# Altium footprint library NtentePoC.PcbLib: 32 footprints (part 1 of 2)
Each footprint in its own frame and in the unit in brackets; x right, y up, seen from the top. Pads: shape width x height; smd on the part's side, far side on the other; paste and mask are expansions set on the pad; w line width, h text height; cw(c..) or ccw(c..) is an arc to the next point about the centre after c.
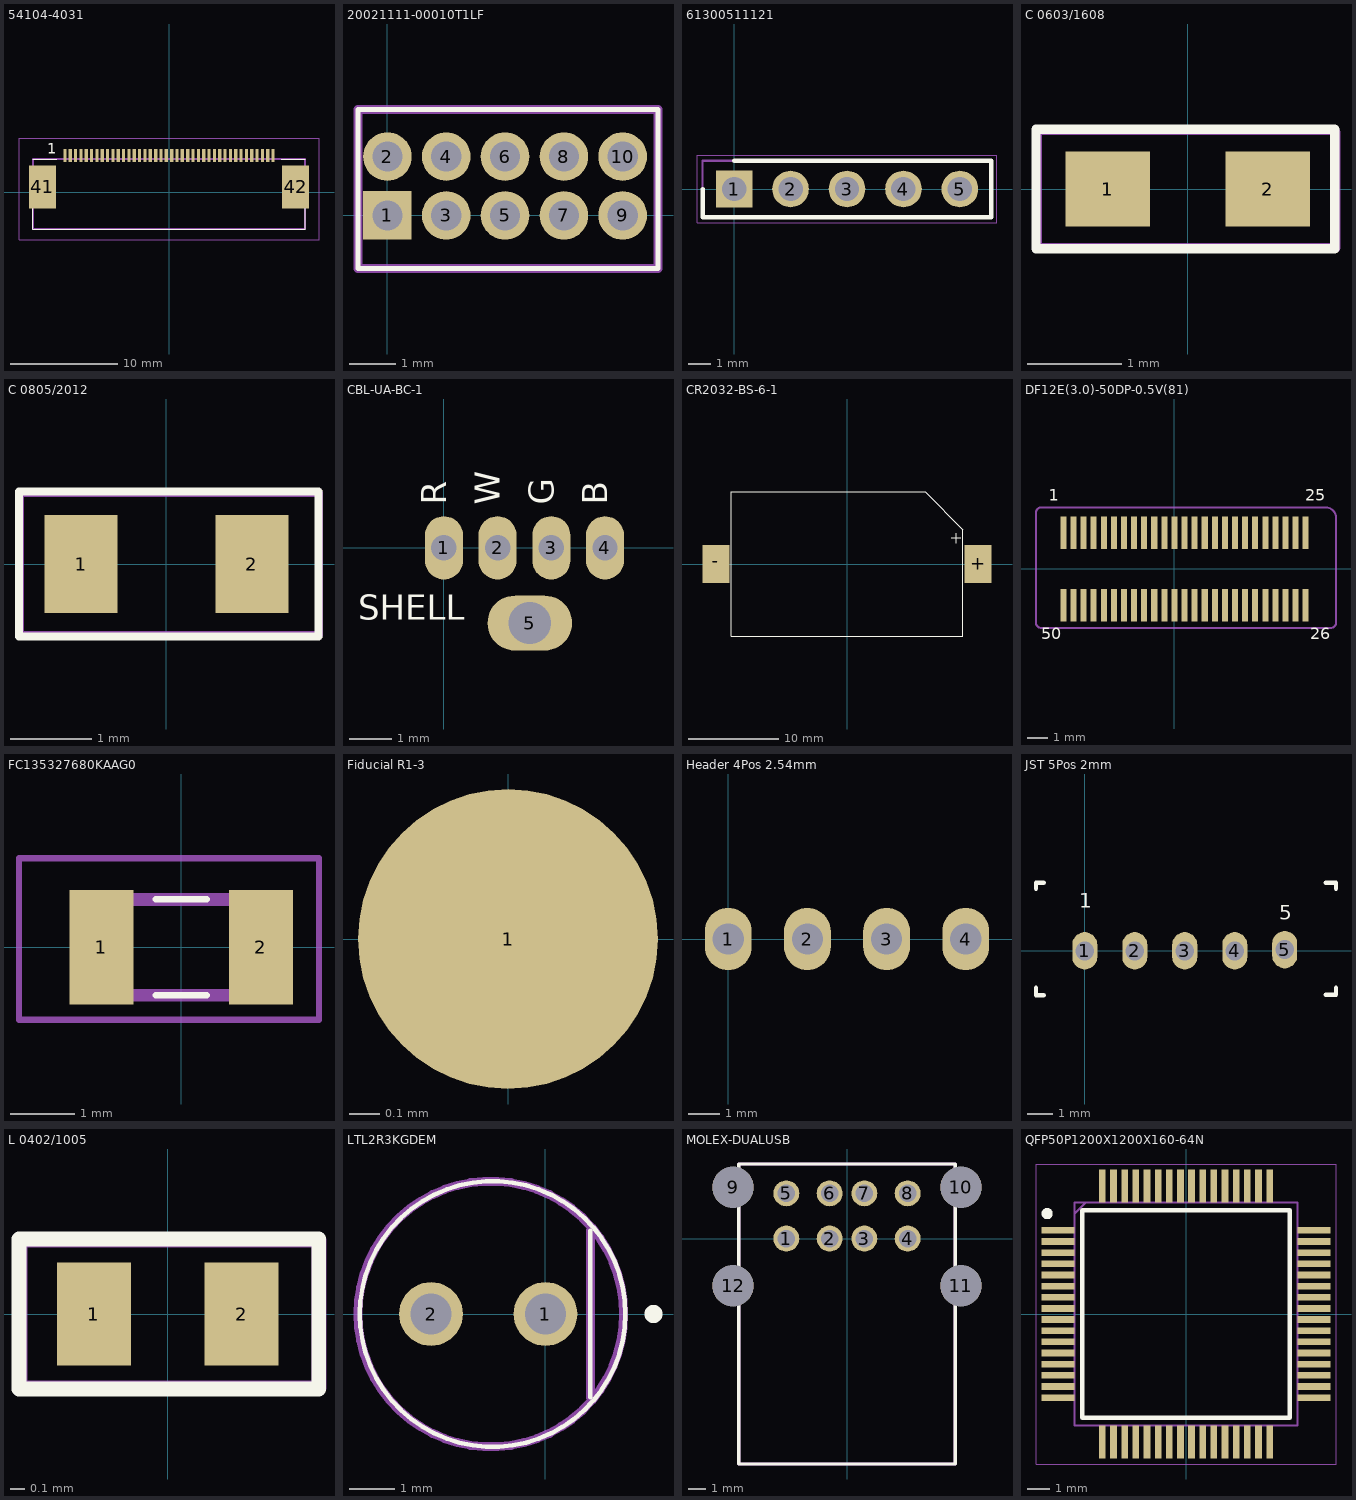
[diagram p0: the footprints below, top view; thin cyan lines are the x and y axes]

## 54104-4031 [mm]
pads (42):
  rect 0.3x1.2 smd: 1(-9.75,3.45) 2(-9.25,3.45) 3(-8.75,3.45) 4(-8.25,3.45) 5(-7.75,3.45) 6(-7.25,3.45) 7(-6.75,3.45) 8(-6.25,3.45) 9(-5.75,3.45) 10(-5.25,3.45) 11(-4.75,3.45) 12(-4.25,3.45) 13(-3.75,3.45) 14(-3.25,3.45) 15(-2.75,3.45) 16(-2.25,3.45) 17(-1.75,3.45) 18(-1.25,3.45) 19(-0.75,3.45) 20(-0.25,3.45) 21(0.25,3.45) 22(0.75,3.45) 23(1.25,3.45) 24(1.75,3.45) 25(2.25,3.45) 26(2.75,3.45) 27(3.25,3.45) 28(3.75,3.45) 29(4.25,3.45) 30(4.75,3.45) 31(5.25,3.45) 32(5.75,3.45) 33(6.25,3.45) 34(6.75,3.45) 35(7.25,3.45) 36(7.75,3.45) 37(8.25,3.45) 38(8.75,3.45) 39(9.25,3.45) 40(9.75,3.45)
  rect 2.5x4 smd: 41(-11.85,0.49) 42(11.85,0.49)
Top Overlay:
  lines w0.1: -12.75,-0.4 -12.75,-3.45 12.75,-3.45 12.75,-0.4 ; -12.75,3.1 -10.5,3.1 ; 10.5,3.1 12.75,3.1
  text "1" at -11.42,3.59 h1
Mechanical 13:
  lines w0.2: -12.75,-3.45 12.75,-3.45 12.75,3.1 -12.75,3.1 -12.75,-3.45
Mechanical 29 (Mech29):
  lines w0.1: -14.05,-4.45 14.05,-4.45 14.05,5.05 -14.05,5.05 -14.05,-4.45
  text ".Designator" at -4.91,-2.05 h1.52
3D body "541044031.stp": height 2, standoff -0.05, extent -12.76,-2.05 12.74,3.55

## 20021111-00010T1LF [mm]
pads (10):
  rect 1.05x1.05 hole 0.65: 1(0,0)
  round 1.05 hole 0.65: 2(0,1.27) 3(1.27,0) 4(1.27,1.27) 5(2.54,0) 6(2.54,1.27) 7(3.81,0) 8(3.81,1.27) 9(5.08,0) 10(5.08,1.27)
Top Overlay:
  lines w0.1: -0.635,-1.145 5.842,-1.145 5.842,2.286 -0.635,2.286 -0.635,-1.145
Mechanical 29 (Mech29):
  lines w0.2: -0.635,-1.145 -0.635,2.286 5.842,2.286 5.842,-1.145 -0.635,-1.145
  text ".Designator" at 0.381,0.254 h1
3D body "20021111-00010XXLFc.stp": height 5.5, standoff -2.35, extent -0.635,-1.143 5.715,2.257

## 61300511121 [mm]
pads (5):
  rect 1.65x1.65 hole 1.1: 1(0,0)
  round 1.65 hole 1.1: 2(2.54,0) 3(5.08,0) 4(7.62,0) 5(10.16,0)
Top Overlay:
  lines w0.2: -1.42,0 -1.42,-1.27 11.58,-1.27 11.58,1.27 0,1.27
Mechanical 13:
  lines w0.1: -1.42,-1.27 -1.42,1.27 11.58,1.27 11.58,-1.27 -1.42,-1.27
Mechanical 15:
  lines w0.05: -1.67,-1.52 -1.67,1.52 11.83,1.52 11.83,-1.52 -1.67,-1.52
Mechanical 29 (Mech29):
  text ".Designator" at 0.635,-0.384 h2
3D body "61300511121.stp": height 8.54, standoff -3, extent -1.27,-1.27 11.43,1.27

## C 0603/1608 [mm]
pads (2):
  rect 0.9x0.8 smd: 1(-0.85,0) 2(0.85,0)
Top Overlay:
  lines w0.1: -1.612,-0.635 1.563,-0.635 1.563,0.635 -1.612,0.635 -1.612,-0.635
Mechanical 29 (Mech29):
  lines w0.1: -1.6,-0.625 1.575,-0.625 1.575,0.6 1.55,0.625 -1.6,0.625 -1.6,-0.625
  text ".Designator" at -1.4,-0.4 h0.8
3D body: height 0.64, standoff 0, extent 0.85,-0.4 1.3,0.4
3D body: height 0.64, standoff 0, extent -1.3,-0.4 -0.85,0.4
3D body: height 0.64, standoff 0, extent -0.85,-0.4 0.85,0.4

## C 0805/2012 [mm]
pads (2):
  rect 0.9x1.2 smd: 1(-1.05,0) 2(1.05,0)
Top Overlay:
  lines w0.1: -1.812,-0.889 -1.812,0.889 1.871,0.889 1.871,-0.889 -1.812,-0.889
Mechanical 29 (Mech29):
  lines w0.1: -1.8,-0.875 -1.8,0.85 -1.775,0.875 1.875,0.875 1.875,-0.875 -1.8,-0.875
  text ".Designator" at -1.675,-0.55 h1
3D body: height 0.64, standoff 0, extent 1.1,-0.6 1.5,0.6
3D body: height 0.64, standoff 0, extent -1.5,-0.6 -1.05,0.6
3D body: height 0.64, standoff 0, extent -1.05,-0.6 1.1,0.6

## CBL-UA-BC-1 [mm]
pads (5):
  oval 0.9x1.5 hole 0.6: 1(0,0) 2(1.27,0) 3(2.54,0) 4(3.81,0)
  oval 2x1.3 hole 1: 5(2.032,-1.778)
Top Overlay:
  text "R" at 0.254,1.016 h1
  text "W" at 1.524,1.016 h1
  text "G" at 2.794,1.016 h1
  text "B" at 4.064,1.016 h1
  text "SHELL" at -2.032,-1.905 h1

## CR2032-BS-6-1 [mm] "LCSC https://lcsc.com/product-detail/Battery-Holders-Clips-Contacts_Button-battery-holder-CR2032_C70377.html"
pads (2):
  rect 3x4.2 smd: +(14.5,0) -(-14.5,0)
Top Overlay:
  lines w0.1: 11.557,2.921 12.573,2.921 ; 12.065,2.286 12.065,3.429 ; -12.827,-8 12.827,-8 12.827,3.81 8.637,8 -12.827,8 -12.827,-8
3D body: height 3.2, standoff 0, extent -10,-10 10,10

## DF12E(3.0)-50DP-0.5V(81) [mm]
pads (50):
  rect 0.3x1.6 smd: 1(-5.5,1.8) 2(-5,1.8) 3(-4.5,1.8) 4(-4,1.8) 5(-3.5,1.8) 6(-3,1.8) 7(-2.5,1.8) 8(-2,1.8) 9(-1.5,1.8) 10(-1,1.8) 11(-0.5,1.8) 12(0,1.8) 13(0.5,1.8) 14(1,1.8) 15(1.5,1.8) 16(2,1.8) 17(2.5,1.8) 18(3,1.8) 19(3.5,1.8) 20(4,1.8) 21(4.5,1.8) 22(5,1.8) 23(5.5,1.8) 24(6,1.8) 25(6.5,1.8) 26(6.5,-1.8) 27(6,-1.8) 28(5.5,-1.8) 29(5,-1.8) 30(4.5,-1.8) 31(4,-1.8) 32(3.5,-1.8) 33(3,-1.8) 34(2.5,-1.8) 35(2,-1.8) 36(1.5,-1.8) 37(1,-1.8) 38(0.5,-1.8) 39(0,-1.8) 40(-0.5,-1.8) 41(-1,-1.8) 42(-1.5,-1.8) 43(-2,-1.8) 44(-2.5,-1.8) 45(-3,-1.8) 46(-3.5,-1.8) 47(-4,-1.8) 48(-4.5,-1.8) 49(-5,-1.8) 50(-5.5,-1.8)
Top Overlay:
  text "50" at -6.604,-3.683 h1
  text "26" at 6.731,-3.683 h1
  text "25" at 6.477,3.175 h1
  text "1" at -6.223,3.175 h1
Mechanical 29 (Mech29):
  lines w0.1: -6.858,-2.667 ccw(c-6.604,-2.667) -6.604,-2.921 7.747,-2.921 ccw(c7.747,-2.667) 8.001,-2.667 8.001,2.54 ccw(c7.493,2.54) 7.493,3.048 -6.604,3.048 ccw(c-6.604,2.794) -6.858,2.794 -6.858,-2.413 -6.858,-2.667
  text ".Designator" at -1.905,-0.508 h1
3D body "DF12E(3.0)-50DP-0.5V.stp": height 2.55, standoff 0.25, extent -6.842,-2.286 7.858,2.314

## FC135327680KAAG0 [mm]
pads (2):
  rect 1x1.8 smd: 1(-1.25,0) 2(1.25,0)
Top Overlay:
  lines w0.1: -0.4,-0.75 0.4,-0.75 ; -0.4,0.75 0.4,0.75
Mechanical 1:
  text ".Designator" at -2.159,-0.381 h1
Mechanical 13:
  lines w0.2: -1.6,-0.75 -1.6,0.75 1.6,0.75 1.6,-0.75 -1.6,-0.75
Mechanical 29 (Mech29):
  lines w0.1: -2.54,-1.138 2.159,-1.138 2.159,1.397 -2.54,1.397 -2.54,-1.138

## Fiducial R1-3 [mm]
pads (1):
  round 1 smd paste-1 mask+1.5: 1(0,0)

## Header 4Pos 2.54mm [mm]
pads (4):
  oval 1.5x2 hole 1: 1(0,0) 2(2.54,0) 3(5.08,0) 4(7.62,0)
Mechanical 29 (Mech29):
  text ".Designator" at 0.7,-0.49 h1

## JST 5Pos 2mm [mm]
pads (5):
  oval 1x1.5 hole 0.75: 1(0,0) 2(2,0) 3(4,0) 4(6,0) 5(8,0.05)
Top Overlay:
  lines w0.18: -1.95,-1.48 -1.95,-1.77 -1.64,-1.77 ; -1.95,2.49 -1.95,2.72 -1.64,2.72 ; 9.63,-1.76 10.05,-1.76 10.05,-1.48 ; 9.63,2.72 10.05,2.72 10.05,2.49
  text "5" at 7.79,1.04 h1
  text "1" at -0.22,1.52 h1
Mechanical 29 (Mech29):
  text ".Designator" at 0.92,-0.084 h1.52
3D body "User Library-B5B-PH-K-S(LF)(SN).step": height 6, standoff -3.4, extent -1.95,-1.73 9.95,2.77

## L 0402/1005 [mm]
pads (2):
  rect 0.5x0.7 smd: 1(-0.5,0) 2(0.5,0)
Top Overlay:
  lines w0.1: -1.008,-0.508 1.024,-0.508 1.024,0.508 -1.008,0.508 -1.008,-0.508
Mechanical 29 (Mech29):
  lines w0.1: -1,-0.5 -1,0.5 1.025,0.5 1.025,-0.5 -1,-0.5
  text ".Designator" at -0.85,-0.3 h0.6
3D body "User Library-Chip Inductor.step": height 0.47, standoff -0.03, extent -0.5,-0.31 0.5,0.29

## LTL2R3KGDEM [mm]
pads (2):
  round 1.416 hole 0.91: 1(0,0) 2(-2.54,0)
Top Overlay:
  lines w0.1: 1,-1.85 1,1.85 ; -4.122,0 ccw(c-1.172,0) 1.778,0 ccw(c-1.172,0) -4.122,0
  lines w0.2: 2.4,-0.1 ccw(c2.4,0) 2.4,0.1 ccw(c2.4,0) 2.4,-0.1
Mechanical 29 (Mech29):
  lines w0.2: 1,-1.85 1,1.85 ; -4.162,0 cw(c-1.212,0) 1.738,0 cw(c-1.212,0) -4.162,0
  text ".Designator" at -3.683,-0.127 h1
3D body "CircuitWorks-LED DIP 3MM.step": height 6.5, standoff -2, extent -2.87,-1.9 0.63,1.9

## MOLEX-DUALUSB [mm]
pads (12):
  round 1.5 hole 1: 1(-3.5,0) 2(-1,0) 3(1,0) 4(3.5,0) 5(-3.5,2.61) 6(-1,2.61) 7(1,2.61) 8(3.5,2.61)
  round 2.38 hole 2.38 unplated: 9(-6.57,2.96) 10(6.57,2.96) 11(6.57,-2.72) 12(-6.57,-2.72)
Top Overlay:
  lines w0.2: -6.25,-13 -6.25,4.302 6.25,4.302 6.25,-13 -6.25,-13
Mechanical 13:
  lines w0.2: -6.25,-13 -6.25,4.302 6.25,4.302 6.25,-13 -6.25,-13
Mechanical 29 (Mech29):
  text ".Designator" at -2.63,-4.454 h1.52
3D body "67298-3090.stp": height 15.97, standoff -3.18, extent -7.662,-13.796 7.662,4.064

## QFP50P1200X1200X160-64N [mm]
pads (64):
  rect 1.475x0.3 smd: 1(-5.738,3.75) 2(-5.738,3.25) 3(-5.738,2.75) 4(-5.738,2.25) 5(-5.738,1.75) 6(-5.738,1.25) 7(-5.738,0.75) 8(-5.738,0.25) 9(-5.738,-0.25) 10(-5.738,-0.75) 11(-5.738,-1.25) 12(-5.738,-1.75) 13(-5.738,-2.25) 14(-5.738,-2.75) 15(-5.738,-3.25) 16(-5.738,-3.75) 33(5.738,-3.75) 34(5.738,-3.25) 35(5.738,-2.75) 36(5.738,-2.25) 37(5.738,-1.75) 38(5.738,-1.25) 39(5.738,-0.75) 40(5.738,-0.25) 41(5.738,0.25) 42(5.738,0.75) 43(5.738,1.25) 44(5.738,1.75) 45(5.738,2.25) 46(5.738,2.75) 47(5.738,3.25) 48(5.738,3.75)
  rect 0.3x1.475 smd: 17(-3.75,-5.738) 18(-3.25,-5.738) 19(-2.75,-5.738) 20(-2.25,-5.738) 21(-1.75,-5.738) 22(-1.25,-5.738) 23(-0.75,-5.738) 24(-0.25,-5.738) 25(0.25,-5.738) 26(0.75,-5.738) 27(1.25,-5.738) 28(1.75,-5.738) 29(2.25,-5.738) 30(2.75,-5.738) 31(3.25,-5.738) 32(3.75,-5.738) 49(3.75,5.738) 50(3.25,5.738) 51(2.75,5.738) 52(2.25,5.738) 53(1.75,5.738) 54(1.25,5.738) 55(0.75,5.738) 56(0.25,5.738) 57(-0.25,5.738) 58(-0.75,5.738) 59(-1.25,5.738) 60(-1.75,5.738) 61(-2.25,5.738) 62(-2.75,5.738) 63(-3.25,5.738) 64(-3.75,5.738)
Top Overlay:
  circle w0.25: c-6.225,4.5 r0.125
  lines w0.2: -4.65,-4.65 4.65,-4.65 4.65,4.65 -4.65,4.65 -4.65,-4.65
Mechanical 13:
  lines w0.1: -5,4.5 -4.5,5 ; -5,-5 5,-5 5,5 -5,5 -5,-5
Mechanical 15:
  lines w0.05: -6.725,-6.725 6.725,-6.725 6.725,6.725 -6.725,6.725 -6.725,-6.725
Mechanical 29 (Mech29):
  text ".Designator" at -4.48,-1.16 h2
3D body "STM32F105RBT6TR.stp": height 1.6, standoff 0, extent -6,-6 6,6